# Altium footprint library PCB.PcbLib: 72 footprints (part 3 of 5)
Each footprint in its own frame and in the unit in brackets; x right, y up, seen from the top. Pads: shape width x height; smd on the part's side, far side on the other; paste and mask are expansions set on the pad; w line width, h text height; cw(c..) or ccw(c..) is an arc to the next point about the centre after c.
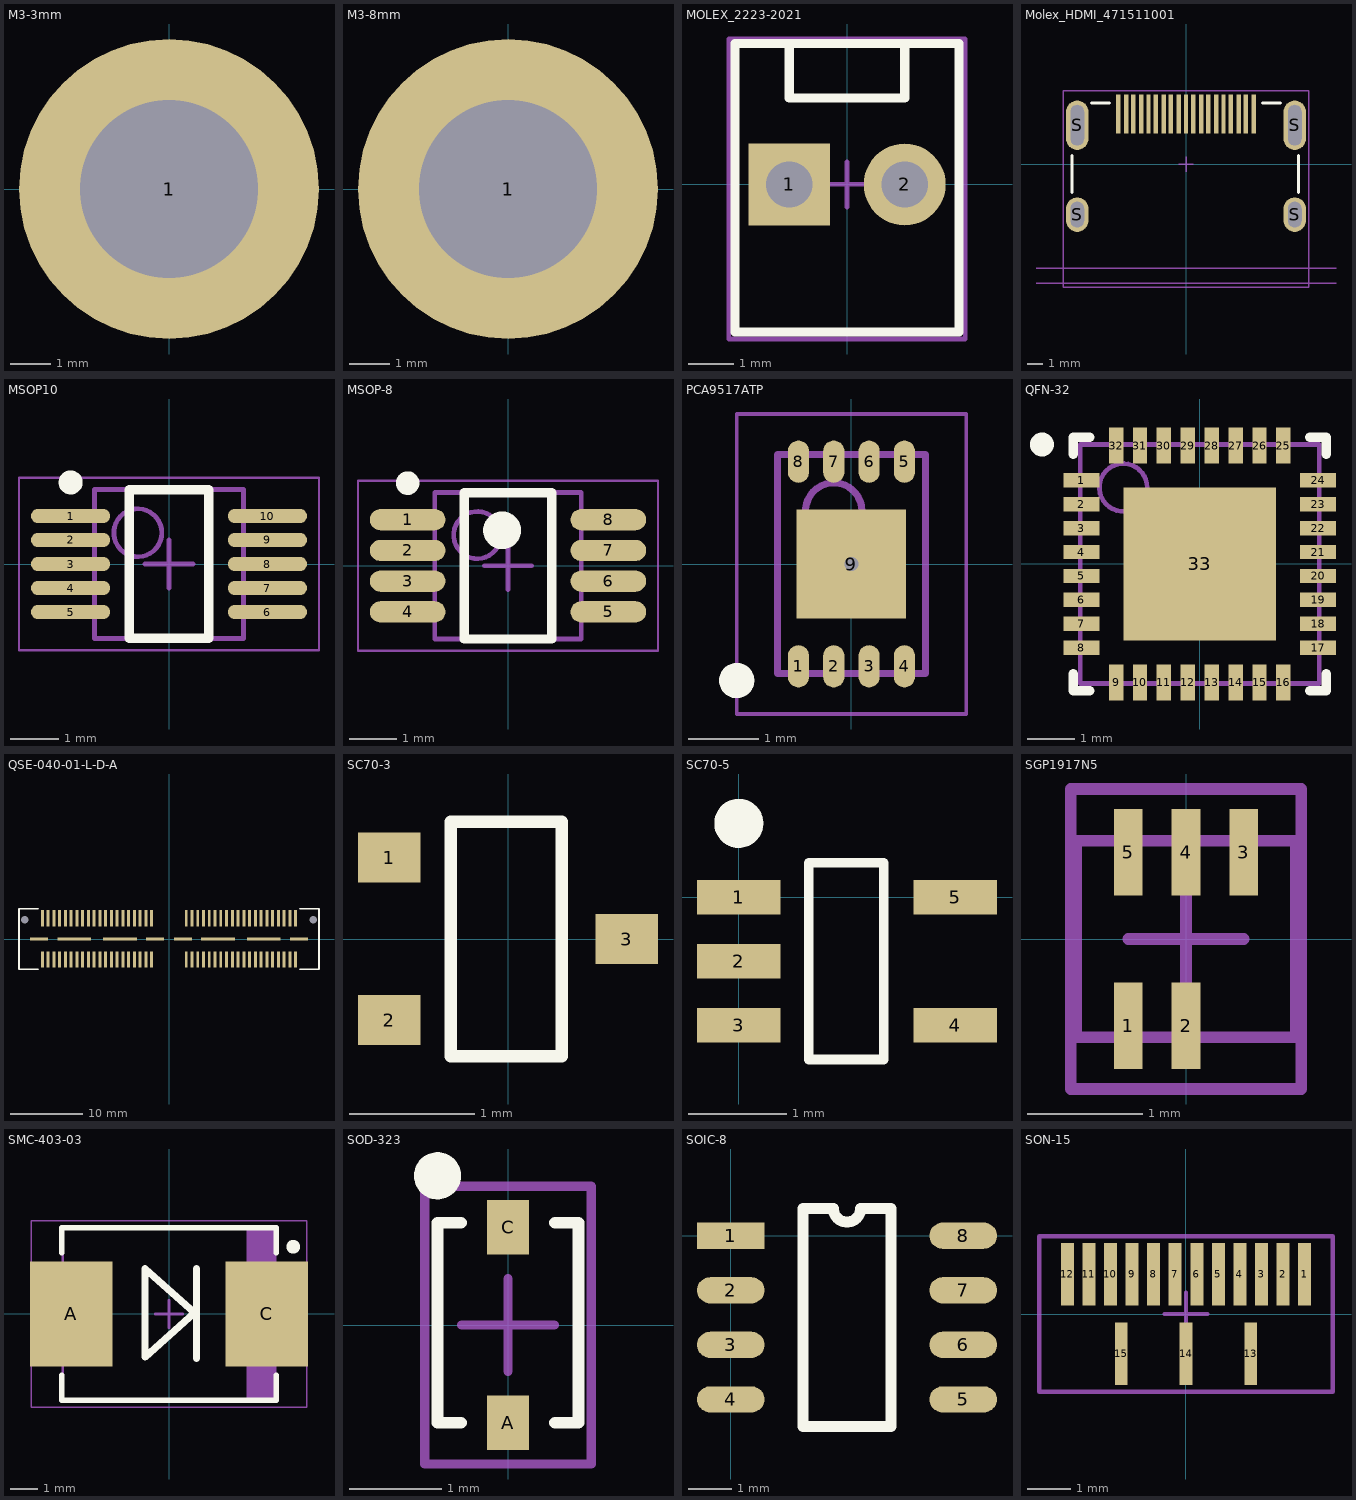
[diagram p2: the footprints below, top view; thin cyan lines are the x and y axes]

## M3-3mm [mm] "SMT Steel Spacer, M3 Thread Internal, 3mm"
height 3
pads (1):
  round 7.4 / inner round 0 / far side round 0 hole 4.4 unplated paste-403.566: 1(0,0)
Top Paste:
  drawing of 4 lines, arcs and shapes, not listed
Mechanical 13:
  circle w0.12: c0,0 r3
3D body: height 3, standoff -1.4, extent -2.994,-3 2.994,2.976

## M3-8mm [mm] "SMT Steel Spacer, M3 Thread Internal, 8mm"
height 8
pads (1):
  round 7.4 / inner round 0 / far side round 0 hole 4.4 unplated paste-403.566: 1(0,0)
Top Paste:
  drawing of 4 lines, arcs and shapes, not listed
Mechanical 13:
  circle w0.12: c0,0 r3
3D body: height 8, standoff -1.4, extent -2.994,-3 2.994,2.976

## MOLEX_2223-2021 [mm] "Pinhead male 1x2 pitch 2.54mm straight"
pads (2):
  rect 1.8x1.8 hole 1.02: 1(-1.27,0)
  round 1.8 hole 1.02: 2(1.27,0)
Top Overlay:
  lines w0.2: -1.27,3.1 -1.27,1.905 1.27,1.905 1.27,3.1 ; -2.465,-3.25 2.465,-3.25 2.465,3.1 -2.465,3.1 -2.465,-3.25
Mechanical 13:
  lines w0.1: -1.27,3.1 -1.27,1.905 1.27,1.905 1.27,3.1 ; -2.465,-3.25 2.465,-3.25 2.465,3.1 -2.465,3.1 -2.465,-3.25
Mechanical 15:
  lines w0.1: -0.5,0 0.5,0 ; 0,-0.5 0,0.5 ; -2.6,-3.4 -2.6,3.2 2.6,3.2 2.6,-3.4 -2.6,-3.4
3D body: height 10.68, standoff -3.54, extent -2.489,-3.2 2.438,3.15

## Molex_HDMI_471511001 [mm] "HEADER, RIGHT ANGLE, HDMI"
height 5
pads (23):
  rect 0.3x2.6 smd: 1(4.5,3.36) 2(4,3.36) 3(3.5,3.36) 4(3,3.36) 5(2.5,3.36) 6(2,3.36) 7(1.5,3.36) 8(1,3.36) 9(0.5,3.36) 10(0,3.36) 11(-0.5,3.36) 12(-1,3.36) 13(-1.5,3.36) 14(-2,3.36) 15(-2.5,3.36) 16(-3,3.36) 17(-3.5,3.36) 18(-4,3.36) 19(-4.5,3.36)
  oval 1.5x2.3 hole 0.9 slot 1.7 at 90 deg: S(-7.25,-3.36) S(7.25,-3.36)
  oval 1.5x3.3 hole 0.9 slot 2.7 at 90 deg: S(-7.25,2.6) S(7.25,2.6)
Top Overlay:
  lines w0.2: -7.6,-1.9 -7.6,0.6 ; -6.3,4.1 -5.1,4.1 ; 5.1,4.1 6.3,4.1 ; 7.5,-1.9 7.5,0.6
Mechanical 15:
  lines w0.1: -0.5,0 0.5,0 ; 0,-0.5 0,0.5 ; -8.2,-8.2 8.2,-8.2 8.2,4.9 -8.2,4.9 -8.2,2.7 -8.2,-8.2
Mechanical 16:
  lines w0.1: -10,-7.95 10,-7.95 ; -10,-6.95 10,-6.95
Mechanical 17:
  text "PCB Edge" at -2.75,-6.2 h0.76
  text "Panel wall (front face)" at -7.85,-9.2 h0.76
3D body: height 6.28, standoff -2.1, extent -7.55,-8.075 7.45,4.075

## MSOP10 [mm] "MSOP, 10-Leads, Body 3.00x3.00mm, Pitch 0.50mm, IPC Medium Density"
height 1.1
pads (10):
  oval 1.65x0.3 smd: 1(-2.05,1) 2(-2.05,0.5) 3(-2.05,0) 4(-2.05,-0.5) 5(-2.05,-1) 6(2.05,-1) 7(2.05,-0.5) 8(2.05,0) 9(2.05,0.5) 10(2.05,1)
Top Overlay:
  circle w0.25: c-2.05,1.7 r0.125
  lines w0.2: -0.825,-1.55 0.825,-1.55 0.825,1.55 -0.825,1.55 -0.825,-1.55
Mechanical 13:
  circle w0.1: c-0.65,0.65 r0.5
  lines w0.1: -1.55,-1.55 1.55,-1.55 1.55,1.55 -1.55,1.55 -1.55,-1.55
Mechanical 15:
  lines w0.05: -3.125,-1.8 3.125,-1.8 3.125,1.8 -3.125,1.8 -3.125,-1.8
  lines w0.1: -0.5,0 0.5,0 ; 0,-0.5 0,0.5
3D body: height 1.1, standoff 0.1, extent -1.55,-1.55 1.55,1.55

## MSOP-8 [mm]
height 1.1
pads (8):
  oval 1.6x0.45 smd: 1(-2.125,0.975) 2(-2.125,0.325) 3(-2.125,-0.325) 4(-2.125,-0.975) 5(2.125,-0.975) 6(2.125,-0.325) 7(2.125,0.325) 8(2.125,0.975)
Top Overlay:
  circle w0.25: c-2.125,1.75 r0.125
  circle w0.4: c-0.125,0.75 r0.2
  lines w0.2: -0.925,-1.55 -0.925,1.55 0.925,1.55 0.925,-1.55 -0.925,-1.55
Mechanical 13:
  circle w0.1: c-0.65,0.65 r0.5
  lines w0.1: -1.55,-1.55 -1.55,1.55 1.55,1.55 1.55,-1.55 -1.55,-1.55
Mechanical 15:
  lines w0.05: -3.175,-1.8 -3.175,1.8 3.175,1.8 3.175,-1.8 -3.175,-1.8
  lines w0.1: -0.5,0 0.5,0 ; 0,-0.5 0,0.5
3D body: height 1.15, standoff 0, extent -2.45,-1.524 2.45,1.476

## PCA9517ATP [mm]
height 0.75
pads (9):
  oval 0.3x0.6 smd: 1(-0.75,-1.45) 2(-0.25,-1.45) 3(0.25,-1.45) 4(0.75,-1.45) 5(0.75,1.45) 6(0.25,1.45) 7(-0.25,1.45) 8(-0.75,1.45)
  rect 1.55x1.55 smd: 9(0,0)
via 0,0 diameter 0.5 hole 0.2
Top Overlay:
  circle w0.25: c-1.625,-1.651 r0.125
Mechanical 13:
  circle w0.1: c-0.25,0.75 r0.4
  lines w0.1: -1.05,-1.55 1.05,-1.55 1.05,1.55 -1.05,1.55 -1.05,-1.55
Mechanical 15:
  lines w0.05: -1.625,-2.125 1.625,-2.125 1.625,2.125 -1.625,2.125 -1.625,-2.125
  lines w0.1: -0.5,0 0.5,0 ; 0,-0.5 0,0.5
3D body: height 0.75, standoff 0.02, extent -1.05,-1.55 1.05,1.55

## QFN-32 [mm] "QFN, 32-Leads, Body 5,00x5,00mm, Pitch 0,50mm, Thermal Pad 3,20x3,20mm, IPC Medium Density"
height 1
pads (33):
  rect 0.75x0.3 smd: 1(-2.475,1.75) 2(-2.475,1.25) 3(-2.475,0.75) 4(-2.475,0.25) 5(-2.475,-0.25) 6(-2.475,-0.75) 7(-2.475,-1.25) 8(-2.475,-1.75) 17(2.475,-1.75) 18(2.475,-1.25) 19(2.475,-0.75) 20(2.475,-0.25) 21(2.475,0.25) 22(2.475,0.75) 23(2.475,1.25) 24(2.475,1.75)
  rect 0.3x0.75 smd: 9(-1.75,-2.475) 10(-1.25,-2.475) 11(-0.75,-2.475) 12(-0.25,-2.475) 13(0.25,-2.475) 14(0.75,-2.475) 15(1.25,-2.475) 16(1.75,-2.475) 25(1.75,2.475) 26(1.25,2.475) 27(0.75,2.475) 28(0.25,2.475) 29(-0.25,2.475) 30(-0.75,2.475) 31(-1.25,2.475) 32(-1.75,2.475)
  rect 3.2x3.2 smd: 33(0,0)
Top Overlay:
  circle w0.25: c-3.3,2.5 r0.125
  lines w0.2: -2.65,-2.3 -2.65,-2.65 -2.3,-2.65 ; -2.65,2.3 -2.65,2.65 -2.3,2.65 ; 2.3,-2.65 2.65,-2.65 2.65,-2.3 ; 2.3,2.65 2.65,2.65 2.65,2.3
Mechanical 13:
  circle w0.1: c-1.6,1.6 r0.5
  lines w0.1: -2.5,-2.5 -2.5,2.5 2.5,2.5 2.5,-2.5 -2.5,-2.5
3D body: height 1, standoff 0.05, extent -2.5,-2.5 2.5,2.5
3D body: height 0.25, standoff 0, extent -2.5,-2.5 2.5,2.5

## QSE-040-01-L-D-A [mm]
pads (90):
  round 0 hole 1.02: 0(-20.065,2.665) 0(20.065,2.665)
  rect 0.41x2.27 smd: 1(-17.603,-2.86) 2(-17.603,2.87) 3(-16.803,-2.86) 4(-16.803,2.87) 5(-16.003,-2.86) 6(-16.003,2.87) 7(-15.203,-2.86) 8(-15.203,2.87) 9(-14.403,-2.86) 10(-14.403,2.87) 11(-13.603,-2.86) 12(-13.603,2.87) 13(-12.803,-2.86) 14(-12.803,2.87) 15(-12.003,-2.86) 16(-12.003,2.87) 17(-11.203,-2.86) 18(-11.203,2.87) 19(-10.403,-2.86) 20(-10.403,2.87) 21(-9.603,-2.86) 22(-9.603,2.87) 23(-8.803,-2.86) 24(-8.803,2.87) 25(-8.003,-2.86) 26(-8.003,2.87) 27(-7.203,-2.86) 28(-7.203,2.87) 29(-6.403,-2.86) 30(-6.403,2.87) 31(-5.603,-2.86) 32(-5.603,2.87) 33(-4.803,-2.86) 34(-4.803,2.87) 35(-4.003,-2.86) 36(-4.003,2.87) 37(-3.203,-2.86) 38(-3.203,2.87) 39(-2.403,-2.86) 40(-2.403,2.87) 41(2.4,-2.86) 42(2.4,2.87) 43(3.2,-2.86) 44(3.2,2.87) 45(4,-2.86) 46(4,2.87) 47(4.8,-2.86) 48(4.8,2.87) 49(5.6,-2.86) 50(5.6,2.87) 51(6.4,-2.86) 52(6.4,2.87) 53(7.2,-2.86) 54(7.2,2.87) 55(8,-2.86) 56(8,2.87) 57(8.8,-2.86) 58(8.8,2.87) 59(9.6,-2.86) 60(9.6,2.87) 61(10.4,-2.86) 62(10.4,2.87) 63(11.2,-2.86) 64(11.2,2.87) 65(12,-2.86) 66(12,2.87) 67(12.8,-2.86) 68(12.8,2.87) 69(13.6,-2.86) 70(13.6,2.87) 71(14.4,-2.86) 72(14.4,2.87) 73(15.2,-2.86) 74(15.2,2.87) 75(16,-2.86) 76(16,2.87) 77(16.8,-2.86) 78(16.8,2.87) 79(17.6,-2.86) 80(17.6,2.87)
  rect 2.54x0.43 smd: 81(-18.069,-0.002) 84(-1.942,-0.002) 85(1.942,-0.001) 88(18.069,-0.001)
  rect 4.7x0.43 smd: 82(-13.178,-0.002) 83(-6.832,-0.001) 86(6.832,-0.001) 87(13.178,-0.001)
Top Overlay:
  lines w0.254: -18.2,-4.2 -20.86,-4.2 -20.86,4.2 -18.2,4.2 ; 18.2,-4.2 20.86,-4.2 20.86,4.2 18.2,4.2
3D body: height 3.23, standoff -0.34, extent -20.64,-3.737 20.635,3.756

## SC70-3 [mm] "SC70, 3-Leads, Pitch 0,65mm, EIAJ SC-88a"
height 1.1
pads (3):
  rect 0.5x0.4 smd: 1(-0.95,0.65) 2(-0.95,-0.65) 3(0.95,0)
Top Overlay:
  lines w0.1: -0.457,-0.94 0.432,-0.94 0.432,0.94 -0.457,0.94 -0.457,-0.94
3D body: height 1, standoff 0, extent -1.15,-1.075 1.15,1.025

## SC70-5 [mm] "SC70, 5-Leads, Pitch 0,65mm, EIAJ SC-88a"
height 1.1
pads (5):
  rect 0.85x0.35 smd: 1(0,0) 2(0,-0.65) 3(0,-1.3) 4(2.2,-1.3) 5(2.2,0)
Top Overlay:
  circle w0.25: c0,0.75 r0.125
  lines w0.1: 0.711,-1.65 1.473,-1.65 1.473,0.35 0.711,0.35 0.711,-1.65
3D body: height 0.96, standoff 0.01, extent 0.068,-1.635 2.168,0.365

## SGP1917N5 [mm]
height 0.55
pads (5):
  rect 0.25x0.75 smd: 1(-0.5,-0.75) 2(0,-0.75) 3(0.5,0.75) 4(0,0.75) 5(-0.5,0.75)
Mechanical 13:
  lines w0.1: -0.95,-0.85 -0.95,0.85 0.95,0.85 0.95,-0.85 -0.95,-0.85
Mechanical 15:
  lines w0.1: -0.5,0 0.5,0 ; 0,-0.5 0,0.5 ; -1,-1.3 1,-1.3 1,1.3 -0.5,1.3 -1,1.3 -1,-1.3
3D body: height 0.55, standoff 0, extent -0.95,-0.85 0.95,0.85

## SMC-403-03 [mm] "SMC-403-03 package"
height 2.13
pads (2):
  rect 3x3.81 smd: A(-3.56,0) C(3.56,0)
Top Overlay:
  circle w0.25: c4.525,2.45 r0.125
  lines w0.2: -3.9,-2.225 -3.9,-3.15 3.9,-3.15 3.9,-2.225 ; -3.9,2.225 -3.9,3.15 3.9,3.15 3.9,2.225
  lines w0.254: 1,-1.625 1,1.65 ; -0.875,-1.575 0.925,0.05 -0.875,1.65 -0.875,-1.575
Mechanical 13:
  rectangle: 2.833,-3.126 3.875,3.124
  lines w0.1: -3.875,-3.125 -3.875,3.125 3.875,3.125 3.875,-3.125 -3.875,-3.125
Mechanical 15:
  lines w0.05: -5.025,-3.4 -5.025,3.4 5.025,3.4 5.025,-3.4 -5.025,-3.4
  lines w0.1: -0.5,0 0.5,0 ; 0,-0.5 0,0.5
3D body: height 2.2, standoff 0, extent -4.125,-3.125 3.875,2.825

## SOD-323 [mm]
pads (2):
  rect 0.45x0.59 smd: A(0,-1.055) C(0,1.055)
Top Overlay:
  circle w0.254: c-0.762,1.612 r0.127
  lines w0.127: -0.508,-1.055 -0.762,-1.055 -0.762,1.104 -0.508,1.104 ; 0.508,-1.055 0.762,-1.055 0.762,1.104 0.508,1.104
Mechanical 15:
  lines w0.1: -0.5,0 0.5,0 ; 0,-0.5 0,0.5 ; -0.9,-1.5 -0.9,1.5 0,1.5 0.9,1.5 0.9,-1.5 -0.9,-1.5
3D body: height 1, standoff 0.01, extent -0.625,-1.25 0.625,1.25

## SOIC-8 [mil]
pads (8):
  rect 62x24 smd: 1(0,0)
  oval 62x24 smd: 2(0,-50) 3(0,-100) 4(0,-150) 5(213,-150) 6(213,-100) 7(213,-50) 8(213,0)
Top Overlay:
  lines w10: 66,-175 147,-175 147,25 119,25 cw(c106.5,25) 94,25 66,25 66,-175
3D body: height 68.7, standoff -0.31, extent -17.03,-173.43 227.04,23.42

## SON-15 [mm]
height 0.8
pads (15):
  rect 0.3x1.45 smd: 1(2.75,0.925) 2(2.25,0.925) 3(1.75,0.925) 4(1.25,0.925) 5(0.75,0.925) 6(0.25,0.925) 7(-0.25,0.925) 8(-0.75,0.925) 9(-1.25,0.925) 10(-1.75,0.925) 11(-2.25,0.925) 12(-2.75,0.925) 13(1.5,-0.925) 14(0,-0.925) 15(-1.5,-0.925)
Mechanical 15:
  lines w0.1: -0.5,0 0.5,0 ; 0,-0.5 0,0.5 ; -3.4,-1.8 3.3,-1.8 3.4,-1.8 3.4,1.8 3.3,1.8 -3.3,1.8 -3.4,1.8 -3.4,-1.8
3D body: height 0.8, standoff -0.01, extent -3.3,-1.3 3.3,1.3